# Altium integrated library SubjuGator8.IntLib: 247 symbols (part 1 of 2) (continued)
## Res
designator R?  value 10k  (hidden comment: *)
Supplier 1: Digi-Key; Supplier Part Number 1: RMCF0603JT10K0CT-ND
footprint RES0603 (Chip Resistor, 2-Leads, Body 1.60x0.80mm, IPC Medium Density)
footprint FMP300 (Power resistor)
footprint FMP200 (Power resistor Yageo 2W)
footprint RES0402 (Chip Resistor, 2-Leads, Body 1.00x0.50mm, changed from previous)
footprint RES2512 (Chip Resistor, 2-Leads, Body 6.35x3.20mm, IPC Medium Density)
footprint RES1206 (Chip Resistor, 2-Leads, Body 3.20x1.60mm, IPC Medium Density)
footprint RES0805 (Chip Resistor, 2-Leads, Body 2.01x1.25mm, IPC Medium Density)
footprint WSBM8518L5000JK
pins: 1 A, 2 B

## RLS-567
designator L?
Inductor; Manufacturer_Name: RECOM Power; Manufacturer_Part_Number: RLS-567; Datasheet Link: https://componentsearchengine.com/Datasheets/1/RLS-567.pdf; Height: 3.1mm; Mouser Part Number: 919-RLS-567; Mouser Price/Stock: https://www.mouser.com/Search/Refine.aspx?Keyword=919-RLS-567
footprint RLS567
pins: 1, 2

## SPDT Slide Switch
designator S?  (value not drawn)
Supplier 1: Digi-Key; Supplier Part Number 1: 563-1318-1-ND
footprint CL-SB-12B-01T (SWITCH SLIDE SPDT 200MA 12V)
pins: 1, 2, 3

## SPST Slide Switch
designator SW?, comment 360-2610-ND
SPST Slide Switch; Supplier 1: Digi-Key; Supplier Part Number 1: 360-2610-ND
footprint AS11CP (SPST Slide Switch)
pins: In, Out

## SRN6045-8R2Y
designator L?  Inductance: 8.2uH  (hidden comment: SRN6045-8R2Y)
FIXED IND 8.2UH 2.7A 55 MOHM SMD; Manufacturer 1: Bourns Inc; Supplier 1: Digi-Key; Supplier Part Number 1: SRN6045-8R2YCT-ND; Manufacturer Part Number 1: SRN6045-8R2Y
footprint SRN6045 Series Inductor (SRN 6045 Series Inductor Bourns Inc)
pins: 1 A, 2 B

## SRR1206-5R0ML
designator L?, comment 5uH
FIXED IND 5UH 4.7A 22 MOHM SMD; Supplier 1: Digi-Key; Supplier Part Number 1: SRR1206-5R0MLCT-ND
footprint IND_2 (Inductor)
pins: 1 A, 2 B

## SRR1208-120ML
designator L?  Inductance: 12uH  (hidden comment: SRR1208-120ML)
FIXED IND 12UH 4.8A 25 MOHM SMD; Manufacturer 1: Bourns Inc; Supplier 1: Digi-Key; Supplier Part Number 1: SRR1208-120MLCT-ND; Manufacturer Part Number 1: SRR1208-120ML
footprint SRR1208 Series (SSR1208 Series Inductor from Bourns Inc)
pins: 1 A, 2 B

## T520B227M006ATE045
designator *
CAP TANT POLY 220UF 6.3V 1411; Manufacturer 1: Kemet; Manufacturer Part Number 1: T520B227M006ATE045; Supplier 1: Digi-Key; Supplier Part Number 1: 399-5755-1-ND
footprint C1411-molded,polarized (Molded Capacitor, 2-Leads, Body 3.50x2.80mm, IPC Medium Density)
pins: 1 A, 2 B
text: +

## UUD1V330MCL1GS
designator C?
CAP ALUM 33UF 20% 35V SMD; Manufacturer 1: Nichicon; Supplier 1: Digi-Key; Manufacturer Part Number 1: UUD1V330MCL1GS; Supplier Part Number 1: 493-2286-1-ND
footprint UUD1V330MCL1GS (CAP ALUM 33UF 20% 35V SMD)
pins: 1 A, 2 B
text: +

## XAL7070-562MEB
designator L?  Inductance: 5.6uH  (hidden comment: XAL7070-562MEB)
FIXED IND 5.6UH 13A 13.67 MOHM SMD; Manufacturer 1: Coil Craft; Manufacturer Part Number 1: XAL7070-562MEB
footprint XAL7070-562MEB (5.6uH inductor)
pins: 1 A, 2 B


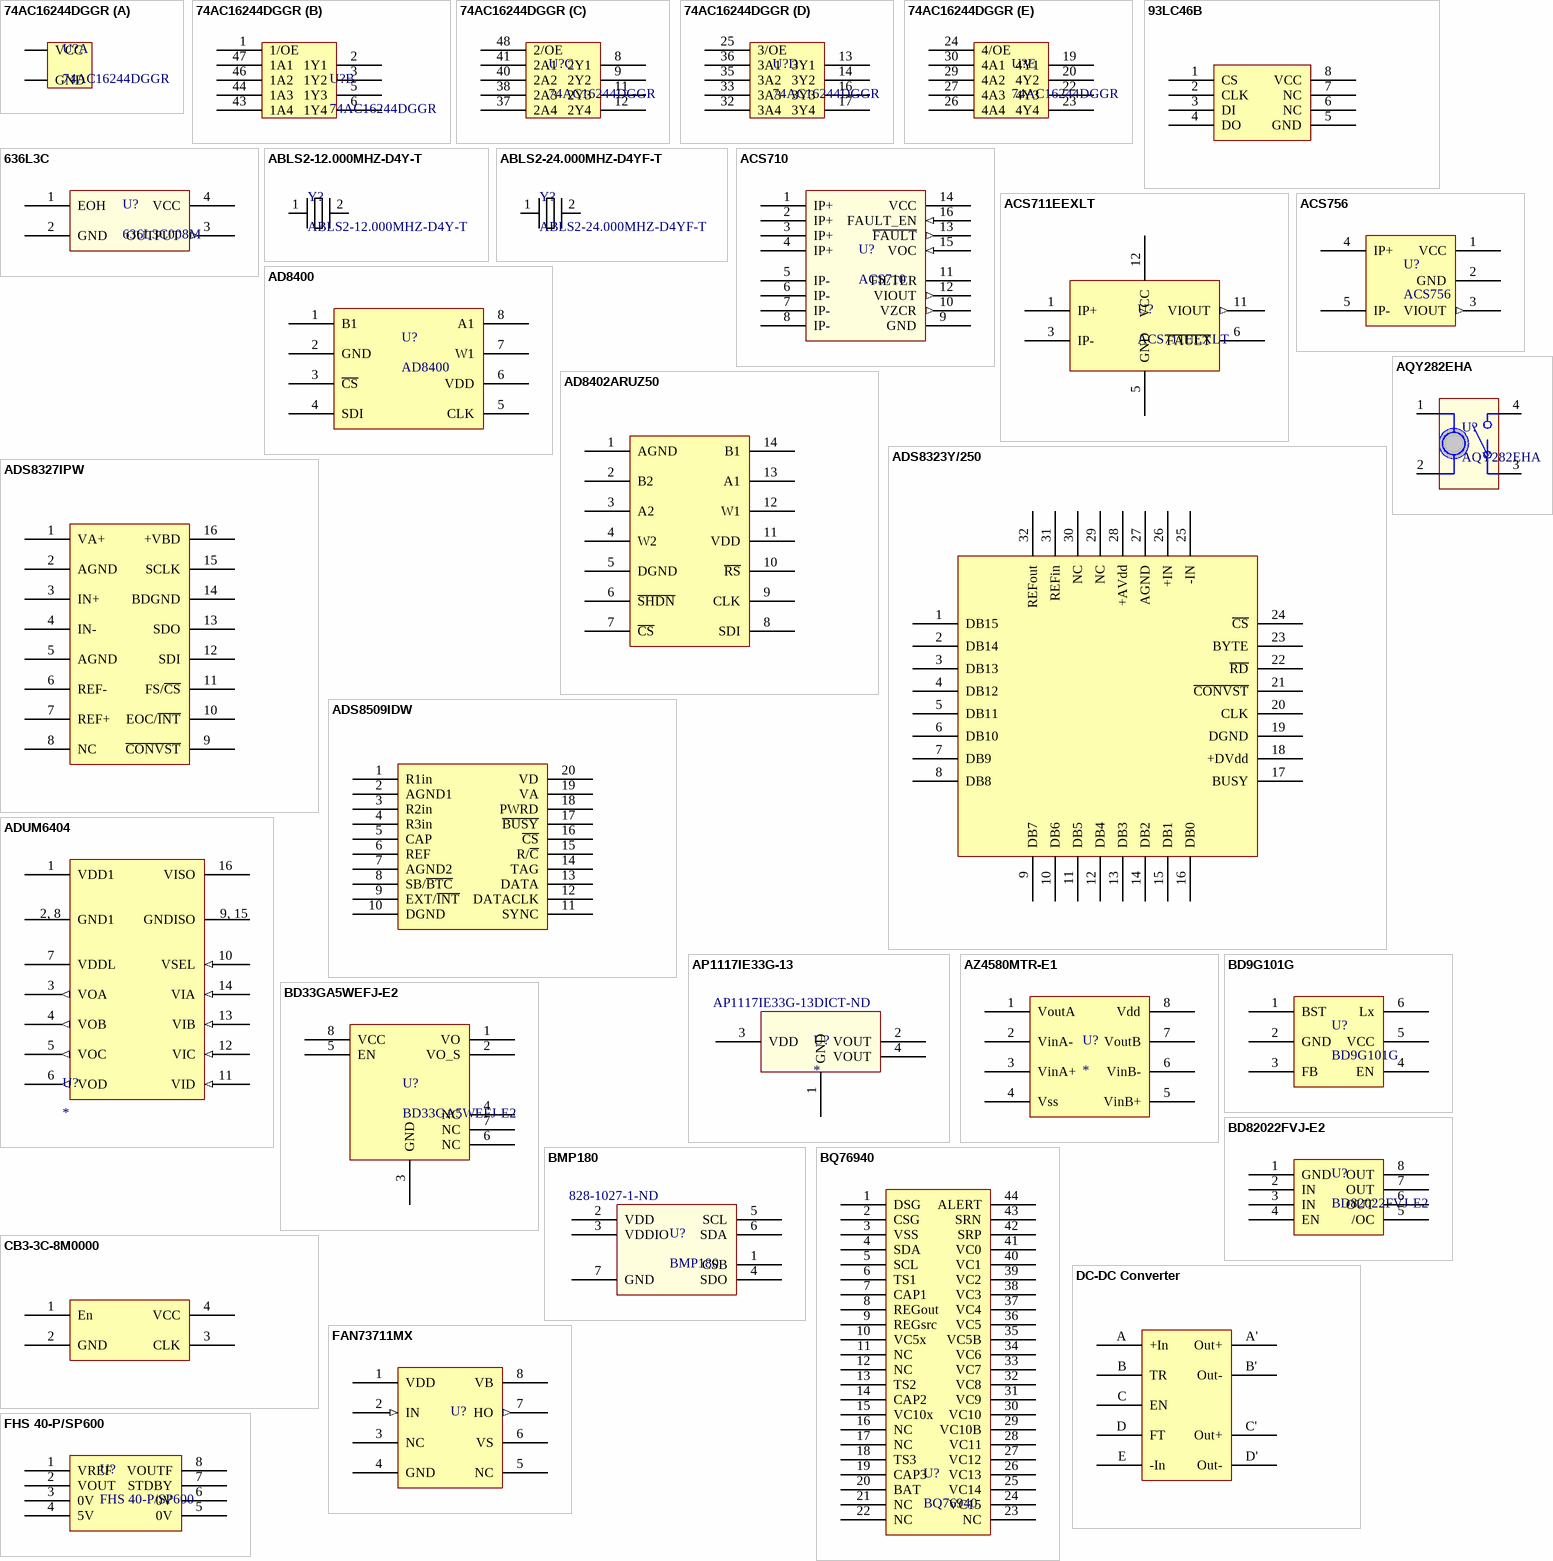
[diagram p4: symbols 74AC16244DGGR to FHS 40-P/SP600]

## 74AC16244DGGR
designator U?
IC BUFF/DVR TRI-ST 16BIT 48TSSOP; Supplier 1: Digi-Key; Supplier Part Number 1: 296-15845-1-ND
footprint 74AC16244DGGR (TSSOP, 48-Leads, Body 12.50x6.10mm, Pitch 0.50mm, IPC Medium Density)
part A pins: GND, VCC
part B pins: 1 1/OE, 2 1Y1, 3 1Y2, 5 1Y3, 6 1Y4, 43 1A4, 44 1A3, 46 1A2, 47 1A1
part C pins: 8 2Y1, 9 2Y2, 11 2Y3, 12 2Y4, 37 2A4, 38 2A3, 40 2A2, 41 2A1, 48 2/OE
part D pins: 13 3Y1, 14 3Y2, 16 3Y3, 17 3Y4, 25 3/OE, 32 3A4, 33 3A3, 35 3A2, 36 3A1
part E pins: 19 4Y1, 20 4Y2, 22 4Y3, 23 4Y4, 24 4/OE, 26 4A4, 27 4A3, 29 4A2, 30 4A1

## 93LC46B
designator U?
IC EEPROM 1KBIT 2MHZ 8SOIC; Supplier 1: Digi-Key; Supplier Part Number 1: 93LC46BT-I/SNCT-ND
footprint SOIC-8pin (For 296-1345-1-ND)
pins: 1 CS, 2 CLK, 3 DI, 4 DO, 5 GND, 6 NC, 7 NC, 8 VCC

## 636L3C
designator U?, comment 636L3C008M
HCMOS/TTL Clock Oscillator; Supplier 1: Digi-Key; Supplier Part Number 1: CTX1005CT-ND
footprint 636L3C
pins: 1 EOH, 2 GND (power), 3 OUTPUT (out), 4 VCC (power)

## ABLS2-12.000MHZ-D4Y-T
designator Y?
12MHz ±30ppm Crystal 18pF 50 Ohm -40°C ~ 85°C Surface Mount HC49/US; Supplier 1: Digi-Key; Supplier Part Number 1: 535-9869-1-ND
footprint HC49/US
pins: 1, 2

## ABLS2-24.000MHZ-D4YF-T
designator Y?
24MHz ±30ppm Crystal 18pF 40 Ohm -40°C ~ 85°C Surface Mount HC49/US; Supplier 1: Digi-Key; Supplier Part Number 1: 535-9881-1-ND
footprint HC49/US
pins: 1, 2

## ACS710
designator U?
Current Sensor with Integrated Overcurrent Detection; Supplier 1: Digi-Key; Supplier Part Number 1: 620-1334-1-ND
footprint ACS710 (SOIC, 16-Leads, Body 10.5x7.6mm (max), Pitch 1.27mm, IPC Medium Density)
footprint ACS710_NOPIN (Hacked footprint to make battery board look nice.)
pins: 1 IP+, 2 IP+, 3 IP+, 4 IP+, 5 IP-, 6 IP-, 7 IP-, 8 IP-, 9 GND (power), 10 VZCR (out), 11 FILTER, 12 VIOUT (out), 13 ~{FAULT} (out), 14 VCC (power), 15 VOC (in), 16 FAULT_EN (in)

## ACS711EEXLT
designator U?
Hall Effect Linear Current Sensor with Overcurrent  Fault Output for < 100 V Isolation Applications; Supplier 1: Digi-Key; Supplier Part Number 1: 620-1484-1-ND
footprint ACS711KEXLT
pins: 1 IP+, 3 IP-, 5 GND, 6 ~{FAULT} (oc), 11 VIOUT (out), 12 VCC (power)

## ACS756
designator U?
Hall Effect-Based Linear Current Sensor IC; Supplier 1: Digi-Key; Supplier Part Number 1: 620-1239-ND
footprint ACS756 (Hall Effect-Based Linear Current Sensor)
pins: 1 VCC (power), 2 GND (power), 3 VIOUT (out), 4 IP+, 5 IP-

## AD8400
designator U?
IC DGTL POT 8BIT 100K 1CH 8-SOIC; Supplier 1: Digi-Key; Supplier Part Number 1: AD8400ARZ100-ND
footprint SOIC-8PIN (For 296-1345-1-ND)
pins: 1 B1, 2 GND, 3 ~{CS}, 4 SDI, 5 CLK, 6 VDD, 7 W1, 8 A1

## AD8402ARUZ50
designator U?, comment 50k Pot
IC POT DIG DUAL 50K 8BIT 14TSSOP; Supplier 1: Digi-Key; Supplier Part Number 1: AD8402ARUZ50-ND
footprint TSSOP-14 (For AD8402ARUZ50-ND (Digital Pot))
pins: 1 AGND, 2 B2, 3 A2, 4 W2, 5 DGND, 6 ~{SHDN}, 7 ~{CS}, 8 SDI, 9 CLK, 10 ~{RS}, 11 VDD, 12 W1, 13 A1, 14 B1

## ADS8323Y/250
designator U?, comment ADC 16bit 500kHz
IC A/D CONV 16BIT BIPLR 32-TQFP; Supplier 1: Digi-Key; Supplier Part Number 1: ADS8323Y/250CT-ND
footprint 32-TQFP (Used for 16 bit external ADC)
pins: 1 DB15, 2 DB14, 3 DB13, 4 DB12, 5 DB11, 6 DB10, 7 DB9, 8 DB8, 9 DB7, 10 DB6, 11 DB5, 12 DB4, 13 DB3, 14 DB2, 15 DB1, 16 DB0, 17 BUSY, 18 +DVdd, 19 DGND, 20 CLK, 21 ~{CONVST}, 22 ~{RD}, 23 BYTE, 24 ~{CS}, 25 -IN, 26 +IN, 27 AGND, 28 +AVdd, 29 NC, 30 NC, 31 REFin, 32 REFout

## ADS8327IPW
designator U?
IC ADC 16BIT 500KSPS 16-TSSOP; Supplier 1: Digi-Key; Supplier Part Number 1: 296-19764-ND
footprint TSSOP-16pin (For 296-19764-ND)
pins: 1 VA+, 2 AGND, 3 IN+, 4 IN-, 5 AGND, 6 REF-, 7 REF+, 8 NC, 9 ~{CONVST}, 10 EOC/~{INT}, 11 FS/~{CS}, 12 SDI, 13 SDO, 14 BDGND, 15 SCLK, 16 +VBD

## ADS8509IDW
designator U?
IC ADC 16BIT 250KSPS SRL 20SOIC; Suppiler Part Number 1: 296-18087-5-ND; Supplier 1: Digi-Key
footprint SOIC-20pin (For 296-18087-5-ND)
pins: 1 R1in, 2 AGND1, 3 R2in, 4 R3in, 5 CAP, 6 REF, 7 AGND2, 8 SB/~{BTC}, 9 EXT/~{INT}, 10 DGND, 11 SYNC, 12 DATACLK, 13 DATA, 14 TAG, 15 R/~{C}, 16 ~{CS}, 17 ~{BUSY}, 18 PWRD, 19 VA, 20 VD

## ADUM6404
designator U?
Digital Isolator, 4 channel, with isolated power
footprint SOIC127P1030X265-16N (SOIC, 16-Leads, Body 10.30x7.50mm, Pitch 1.27mm, IPC Medium Density)
pins: 1 VDD1 (power), 2 GND1 (power), 3 VOA (out), 4 VOB (out), 5 VOC (out), 6 VOD (out), 7 VDDL (power), 8 GND1 (power), 9 GNDISO (power), 10 VSEL (in), 11 VID (in), 12 VIC (in), 13 VIB (in), 14 VIA (in), 15 GNDISO (power), 16 VISO
text: 2, 8; 9, 15

## AP1117IE33G-13
designator U?  Supplier Part Number 1: AP1117IE33G-13DICT-ND
3.3V 1A DROPOUT POSITIVE ADJUSTABLE OR FIXED-MODE REGULATOR; Supplier 1: Digi-Key
footprint AP1117IE33G-13 (SOT223, 4-Leads, Body 6.6x7.1mm (max), Pitch 2.30mm, IPC Medium Density)
pins: 1 GND (power), 2 VOUT (power), 3 VDD (power), 4 VOUT (power)

## AQY282EHA
designator U?
PhotoMOS Solid State Relay; Supplier 1: Digi-Key; Supplier Part Number 1: AQY282EHA-ND
footprint AQY282EHA (SOP, 4-Leads, Body 4.3x4.6mm (max), Pitch 2.54mm, IPC Medium Density)
pins: 1 A, 2 C, 3 S2, 4 S1

## AZ4580MTR-E1
designator U?
IC OPAMP GEN PURP SO-8; Supplier 1: Digi-Key; Supplier Part Number 1: AZ4580MTR-E1DICT-ND
footprint 8-SOIC (Used for LMH6612)
pins: 1 VoutA, 2 VinA-, 3 VinA+, 4 Vss, 5 VinB+, 6 VinB-, 7 VoutB, 8 Vdd

## BD9G101G
designator U?
Simple Step-down Switching Regulators with Built-in Power MOSFET; Supplier 1: Digi-Key; Supplier Part Number 1: BD9G101G-CT-ND
footprint BD9G101G (Simple Step-down Switching Regulators with Built-in Power MOSFET)
pins: 1 BST, 2 GND, 3 FB, 4 EN, 5 VCC, 6 Lx

## BD33GA5WEFJ-E2
designator U?
IC REG LDO 3.3V 0.5A 8HTSOP-J; Supplier 1: Digi-Key; Supplier Part Number 1: BD33GA5WEFJ-E2CT-ND
footprint BD33GA5WEFJ-E2 (IC REG LDO 3.3V 0.5A 8HTSOP-J)
pins: 1 VO, 2 VO_S, 3 GND, 4 NC, 5 EN, 6 NC, 7 NC, 8 VCC

## BD82022FVJ-E2
designator U?
IC USB PWR SW HI SIDE 1CH 8TSSOP; Manufacturer 1: Rohm Semiconductor; Manufacturer Part Number 1: BD82022FVJ-E2; Supplier Part Number 1: BD82022FVJ-E2CT-ND; Supplier 1: Digi-Key
footprint TSSOP-8 (TSOP, 8-Leads, Body 3.00x3.00mm, Pitch 0.65mm, IPC Medium Density)
pins: 1 GND, 2 IN, 3 IN, 4 EN, 5 /OC, 6 OUT, 7 OUT, 8 OUT

## BMP180
designator U?  Supplier Part Number 1: 828-1027-1-ND
Digital Pressure Sensor; Supplier 1: Digi-Key
footprint BMP180
pins: 1 CSB, 2 VDD (power), 3 VDDIO (power), 4 SDO, 5 SCL, 6 SDA, 7 GND (power)

## BQ76940
designator U?
IC BATT MFMT LI-ION AFE 44TSOP; Supplier 1: Digi-Key; Supplier Part Number 1: 296-37789-5-ND
footprint BQ7694003DBT (TSSOP, 44-Leads, Body 11.15x4.40mm, Pitch 0.50mm, IPC Medium Density)
pins: 1 DSG, 2 CSG, 3 VSS, 4 SDA, 5 SCL, 6 TS1, 7 CAP1, 8 REGout, 9 REGsrc, 10 VC5x, 11 NC, 12 NC, 13 TS2, 14 CAP2, 15 VC10x, 16 NC, 17 NC, 18 TS3, 19 CAP3, 20 BAT, 21 NC, 22 NC, 23 NC, 24 VC15, 25 VC14, 26 VC13, 27 VC12, 28 VC11, 29 VC10B, 30 VC10, 31 VC9, 32 VC8, 33 VC7, 34 VC6, 35 VC5B, 36 VC5, 37 VC4, 38 VC3, 39 VC2, 40 VC1, 41 VC0, 42 SRP, 43 SRN, 44 ALERT

## CB3-3C-8M0000
designator U?, comment 8MHz Oscillator
OSC XO 8.000MHZ HCMOS TTL SMD; Supplier 1: Digi-Key; Supplier Part Number 1: CTX264CT-ND
footprint 4-SMD (For 8MHz Oscillator)
pins: 1 En, 2 GND, 3 CLK, 4 VCC

## DC-DC Converter
designator U?
28V Switching Regulator; Manufacturer 1: Vicorpower; Manufacturer Part Number 1: DCM48AP280T320A50
footprint DCM Footprint (For DC-DC Converter Module)
pins: A +In, A' Out+, B TR, B' Out-, C EN, C' Out+, D FT, D' Out-, E -In

## FAN73711MX
designator U?  (value not drawn)
High current, High-side gate drive IC; Supplier 1: Digi-Key; Supplier Part Number 1: FAN73711MXDKR-ND
footprint FAN73711MXCT (High side FET driver)
pins: 1 VDD, 2 IN (in), 3 NC, 4 GND, 5 NC, 6 VS, 7 HO (out), 8 VB

## FHS 40-P/SP600
designator U?
Supplier 1: Digi-Key; Supplier Part Number 1: 398-1057-1-ND
footprint FHS 40-P/SP600 (SENSOR CURRENT 100A 5V BI 8SOIC)
pins: 1 VREF, 2 VOUT, 3 0V, 4 5V, 5 0V, 6 0V, 7 STDBY, 8 VOUTF

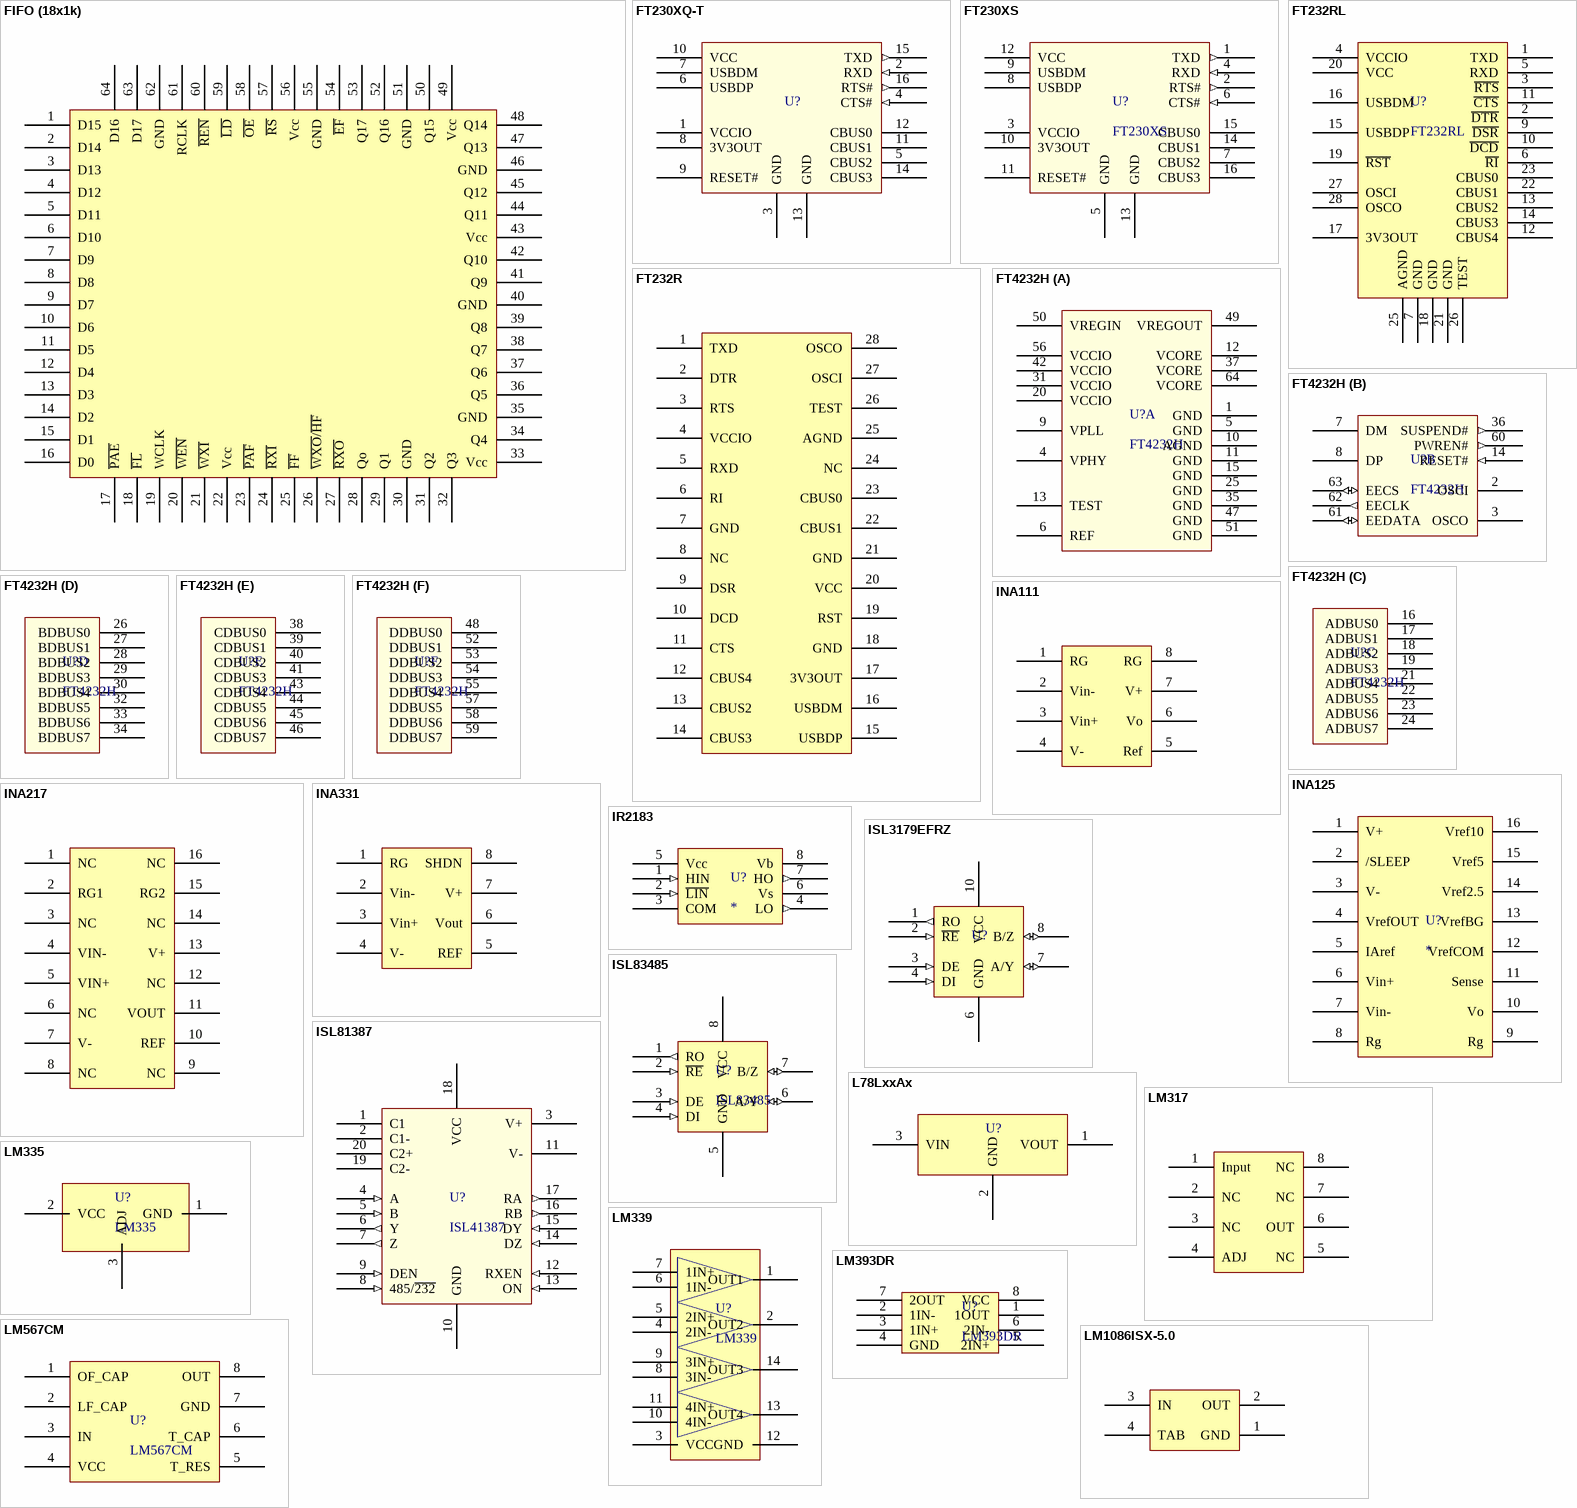
[diagram p5: symbols FIFO (18x1k) to LM1086ISX-5.0]

## FIFO (18x1k)
designator U?
IC SYNC FIFO MEM 1KX18 64LQFP; Supplier 1: Digi-Key; Supplier Part Number 1: CY7C4225-10AXI-ND
footprint 64-LQFP (For IDT 64 pin FIFO)
pins: 1 D15, 2 D14, 3 D13, 4 D12, 5 D11, 6 D10, 7 D9, 8 D8, 9 D7, 10 D6, 11 D5, 12 D4, 13 D3, 14 D2, 15 D1, 16 D0, 17 ~{PAE}, 18 ~{FL}, 19 WCLK, 20 ~{WEN}, 21 ~{WXI}, 22 Vcc, 23 ~{PAF}, 24 ~{RXI}, 25 ~{FF}, 26 ~{WXO}/~{HF}, 27 ~{RXO}, 28 Qo, 29 Q1, 30 GND, 31 Q2, 32 Q3, 33 Vcc, 34 Q4, 35 GND, 36 Q5, 37 Q6, 38 Q7, 39 Q8, 40 GND, 41 Q9, 42 Q10, 43 Vcc, 44 Q11, 45 Q12, 46 GND, 47 Q13, 48 Q14, 49 Vcc, 50 Q15, 51 GND, 52 Q16, 53 Q17, 54 ~{EF}, 55 GND, 56 Vcc, 57 ~{RS}, 58 ~{OE}, 59 ~{LD}, 60 ~{REN}, 61 RCLK, 62 GND, 63 D17, 64 D16

## FT230XQ-T
designator U?  (value not drawn)
IC USB SERIAL BASIC UART 16QFN; Supplier 1: Digi-Key; Supplier Part Number 1: 768-1153-ND
footprint FT230XQ-T (IC USB SERIAL BASIC UART 16QFN)
pins: 1 VCCIO (power), 2 RXD (in), 3 GND (power), 4 CTS# (in), 5 CBUS2, 6 USBDP, 7 USBDM, 8 3V3OUT, 9 RESET#, 10 VCC (power), 11 CBUS1, 12 CBUS0, 13 GND (power), 14 CBUS3, 15 TXD (out), 16 RTS# (out)

## FT230XS
designator U?
USB To Basic UART IC; Supplier 1: Digi-Key; Supplier Part Number 1: 768-1154-5-ND
footprint FT230XS (SOP, 16-Leads, Body 4.90x3.90mm, Pitch 0.64mm, IPC Medium Density)
pins: 1 TXD (out), 2 RTS# (out), 3 VCCIO (power), 4 RXD (in), 5 GND (power), 6 CTS# (in), 7 CBUS2, 8 USBDP, 9 USBDM, 10 3V3OUT, 11 RESET#, 12 VCC (power), 13 GND (power), 14 CBUS1, 15 CBUS0, 16 CBUS3

## FT232R
designator U?
IC USB FS SERIAL UART 28-SSOP; Supplier 1: Digi-Key; Supplier Part Number 1: 768-1007-1-ND
footprint SSOP-28 (FTDI FT232R)
pins: 1 TXD, 2 DTR, 3 RTS, 4 VCCIO, 5 RXD, 6 RI, 7 GND, 8 NC, 9 DSR, 10 DCD, 11 CTS, 12 CBUS4, 13 CBUS2, 14 CBUS3, 15 USBDP, 16 USBDM, 17 3V3OUT, 18 GND, 19 RST, 20 VCC, 21 GND, 22 CBUS1, 23 CBUS0, 24 NC, 25 AGND, 26 TEST, 27 OSCI, 28 OSCO

## FT232RL
designator U?
IC USB FS SERIAL UART 28-SSOP; Supplier Part Number 1: 768-1007-1-ND; Supplier 1: Digi-Key
footprint SSOP_28_N (For FT232RL-Tube)
pins: 1 TXD, 2 ~{DTR}, 3 ~{RTS}, 4 VCCIO, 5 RXD, 6 ~{RI}, 7 GND, 9 ~{DSR}, 10 ~{DCD}, 11 ~{CTS}, 12 CBUS4, 13 CBUS2, 14 CBUS3, 15 USBDP, 16 USBDM, 17 3V3OUT, 18 GND, 19 ~{RST}, 20 VCC, 21 GND, 22 CBUS1, 23 CBUS0, 25 AGND, 26 TEST, 27 OSCI, 28 OSCO

## FT4232H
designator U?
Quad High Speed USB to Multipurpose UART/MPSSE; Supplier 1: Digi-Key; Supplier Part Number 1: 768-1026-1-ND
footprint FT4232HL (TSQFP, 64-Leads, Body 10.00x10.00mm, Pitch 0.50mm, IPC Medium Density)
part A pins: 1 GND (power), 4 VPHY (power), 5 GND (power), 6 REF, 9 VPLL (power), 10 AGND (power), 11 GND (power), 12 VCORE (power), 13 TEST, 15 GND (power), 20 VCCIO (power), 25 GND (power), 31 VCCIO (power), 35 GND (power), 37 VCORE (power), 42 VCCIO (power), 47 GND (power), 49 VREGOUT (power), 50 VREGIN (power), 51 GND (power), 56 VCCIO (power), 64 VCORE (power)
part B pins: 2 OSCI, 3 OSCO, 7 DM, 8 DP, 14 RESET# (in), 36 SUSPEND# (out), 60 PWREN# (out), 61 EEDATA (io), 62 EECLK (out), 63 EECS (io)
part C pins: 16 ADBUS0, 17 ADBUS1, 18 ADBUS2, 19 ADBUS3, 21 ADBUS4, 22 ADBUS5, 23 ADBUS6, 24 ADBUS7
part D pins: 26 BDBUS0, 27 BDBUS1, 28 BDBUS2, 29 BDBUS3, 30 BDBUS4, 32 BDBUS5, 33 BDBUS6, 34 BDBUS7
part E pins: 38 CDBUS0, 39 CDBUS1, 40 CDBUS2, 41 CDBUS3, 43 CDBUS4, 44 CDBUS5, 45 CDBUS6, 46 CDBUS7
part F pins: 48 DDBUS0, 52 DDBUS1, 53 DDBUS2, 54 DDBUS3, 55 DDBUS4, 57 DDBUS5, 58 DDBUS6, 59 DDBUS7

## INA111
designator U?, comment Instr. Amp
IC OPAMP INSTR 2MHZ 8DIP; Supplier 1: Digi-Key; Supplier Part Number 1: INA111AP-ND
footprint DIP8
pins: 1 RG, 2 Vin-, 3 Vin+, 4 V-, 5 Ref, 6 Vo, 7 V+, 8 RG

## INA125
designator U?
Instrumentation Amplifier; Supplier 1: Digi-Key; Supplier Part Number 1: INA125UA-ND
footprint SOIC127P600X175-16N (SOIC, 16-Leads, Body 9.90x3.90mm, Pitch 1.27mm, IPC Medium Density)
pins: 1 V+, 2 /SLEEP, 3 V-, 4 VrefOUT, 5 IAref, 6 Vin+, 7 Vin-, 8 Rg, 9 Rg, 10 Vo, 11 Sense, 12 VrefCOM, 13 VrefBG, 14 Vref2.5, 15 Vref5, 16 Vref10

## INA217
designator U?
IC OPAMP INSTR 3.4MHZ 16SOIC; Supplier 1: Digi-Key; Supplier Part Number 1: 296-13645-1-ND
footprint SOIC-16
pins: 1 NC, 2 RG1, 3 NC, 4 VIN-, 5 VIN+, 6 NC, 7 V-, 8 NC, 9 NC, 10 REF, 11 VOUT, 12 NC, 13 V+, 14 NC, 15 RG2, 16 NC

## INA331
designator U?, comment Inst. Amp
IC OPAMP INSTR 2MHZ RRO 8VSSOP; Suplier Part Number 1: 296-12202-1-ND; Supplier 1: Digi-Key
footprint TSSOP-8n
pins: 1 RG, 2 Vin-, 3 Vin+, 4 V-, 5 REF, 6 Vout, 7 V+, 8 SHDN

## IR2183
designator U?
Half-Bridge Driver; Supplier 1: Digi-Key; Supplier Part Number 1: IR2183SPBF-ND
footprint IR2183S
pins: 1 HIN (in), 2 ~{LIN} (in), 3 COM (power), 4 LO (out), 5 Vcc (power), 6 Vs (power), 7 HO (out), 8 Vb

## ISL3179EFRZ
designator U?  (value not drawn)
TXRX ESD 3.3V RS-485/422 10-DFN; Supplier 1: Digi-Key; Supplier Part Number 1: ISL3179EFRZ-ND
footprint ISL3179EFRZ (TXRX ESD 3.3V RS-485/422 10-DFN)
footprint ISL3179EFRZ_NO_VIAS (TXRX ESD 3.3V RS-485/422 10-DFN)
pins: 1 RO (out), 2 ~{RE} (in), 3 DE (in), 4 DI (in), 6 GND (power), 7 A/Y (io), 8 B/Z (io), 10 VCC (power)

## ISL81387
designator U?, comment ISL41387
5V RS-232/RS-485 Transceiver
footprint ISL81387IAZ (SOP, 20-Leads, Body 7.3x5.4mm (max), Pitch 0.65mm, IPC Medium Density)
pins: 1 C1, 2 C1-, 3 V+, 4 A (in), 5 B (in), 6 Y (out), 7 Z (out), 8 485/~{232} (in), 9 DEN (in), 10 GND (power), 11 V-, 12 RXEN (in), 13 ON (in), 14 DZ (in), 15 DY (in), 16 RB (out), 17 RA (out), 18 VCC (power), 19 C2-, 20 C2+

## ISL83485
designator U?
3.3V RS485 Transceiver; Supplier 1: Digi-Key; Supplier Part Number 1: ISL83485IBZ-ND
footprint ISL8348xIBZ (SOIC, 8-Leads, Body 4.90x3.90mm, Pitch 1.27mm, IPC Medium Density)
pins: 1 RO (out), 2 ~{RE} (in), 3 DE (in), 4 DI (in), 5 GND (power), 6 A/Y (io), 7 B/Z (io), 8 VCC (power)

## L78LxxAx
designator U?, comment L78L15AC  (value not drawn)
Positive Voltage Regulator; Supplier 1: Digi-Key; Supplier Part Number 1: 497-13129-ND
footprint L78LxxAxZ (Positive voltage regulator TO-92)
footprint L78LxxAxUTR (SOT89, 3-Leads, Body 4.50x2.45mm, Pitch 1.50mm, Lead Span 4.1mm, IPC Medium Density)
pins: 1 VOUT, 2 GND (power), 3 VIN

## LM317
designator U?
IC REG LDO ADJ 0.1A 8SOIC; Supplier 1: Digi-Key; Supplier Part Number 1: 296-26092-5-ND
footprint SOIC-8N (LM317 Footprint)
pins: 1 Input, 2 NC, 3 NC, 4 ADJ, 5 NC, 6 OUT, 7 NC, 8 NC

## LM335
designator U?
IC SENSOR PRECISION TEMP TO92-3; Supplier: Digikey; Supplier Part Number: LM335ZNS/NOPB-ND
footprint LM335 (IC SENSOR PRECISION TEMP TO92-3)
pins: 1 GND, 2 VCC, 3 ADJ

## LM339
designator U?
IC QUAD DIFF COMPARATOR 14-TSSOP; Supplier 1: Digi-Key; Supplier Part Number 1: 296-18454-1-ND
footprint LM339 (TSOP, 14-Leads, Body 5.00x4.40mm, Pitch 0.65mm, IPC Medium Density)
pins: 1 OUT1, 2 OUT2, 3 VCC, 4 2IN-, 5 2IN+, 6 1IN-, 7 1IN+, 8 3IN-, 9 3IN+, 10 4IN-, 11 4IN+, 12 GND, 13 OUT4, 14 OUT3

## LM393DR
designator U?
LM393DR Comparator; Supplier 1: Digi-key; Supplier Part Number 1: 296-1015-1-ND
footprint LM393DR
pins: 1 1OUT, 2 1IN-, 3 1IN+, 4 GND, 5 2IN+, 6 2IN-, 7 2OUT, 8 VCC

## LM567CM
designator U?
IC TONE DECODR PHAS LOC LP 8SOIC; Supplier Part Number 1: LM567CM/NOPB-ND; Supplier 1: Digi-Key
footprint SOIC-8PIN (For 296-1345-1-ND)
pins: 1 OF_CAP, 2 LF_CAP, 3 IN, 4 VCC, 5 T_RES, 6 T_CAP, 7 GND, 8 OUT

## LM1086ISX-5.0
designator U?, comment 5V LDO Regulator
IC REG LDO 5V 1.5A DDPAK; Supplier Part Number 1: LM1086ISX-5.0/NOPBCT-ND; Supplier 1: Digi-Key
footprint DPAK254P1435X464-4N (D2-PAK, 4-Pads, Body 7.55x8.56mm (max), IPC Medium Density)
pins: 1 GND, 2 OUT, 3 IN, 4 TAB

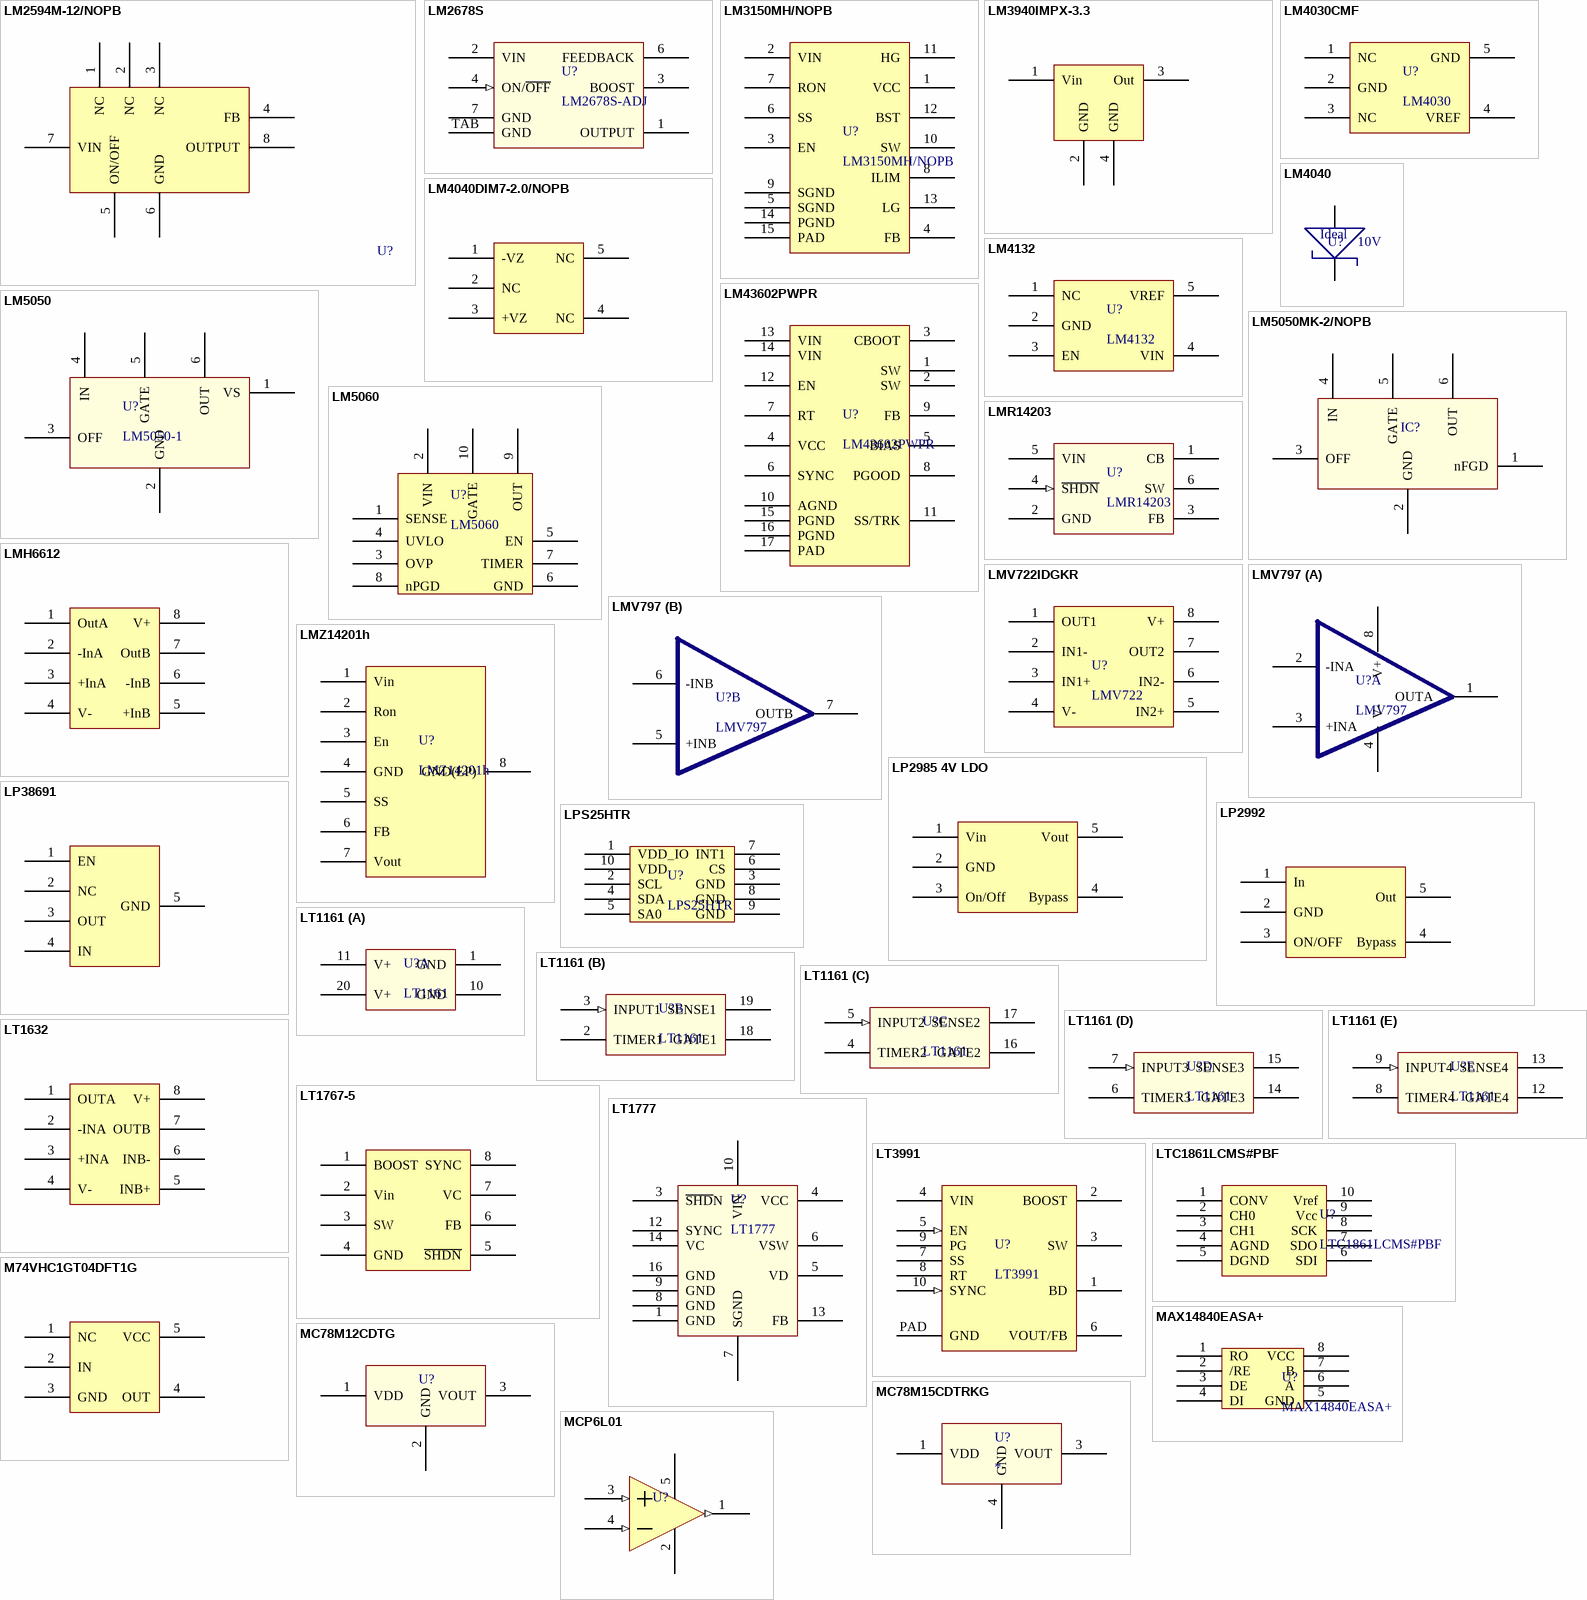
[diagram p6: symbols LM2594M-12/NOPB to MCP6L01]

## LM2594M-12/NOPB
designator U?  (value not drawn)
IC REG BUCK 12V 0.5A 8-SOIC; Supplier 1: Digi-Key; Supplier Part Number 1: LM2594M-12/NOPB-ND
footprint LM2594M-12/NOPB (IC REG BUCK 12V 0.5A 8-SOIC)
pins: 1 NC, 2 NC, 3 NC, 4 FB, 5 ON/OFF, 6 GND, 7 VIN, 8 OUTPUT

## LM2678S
designator U?, comment LM2678S-ADJ
Simple Switcher High Efficiency 5A Step-Down Voltage Regulator; Supplier 1: Digi-Key; Supplier Part Number 1: LM2678SX-ADJ/NOPBCT-ND
footprint LM2678S
pins: 1 OUTPUT, 2 VIN (power), 3 BOOST, 4 ON/~{OFF} (in), 6 FEEDBACK (power), 7 GND (power), TAB GND (power)

## LM3150MH/NOPB
designator U?
IC REG CTRLR BUCK 14TSSOP; Manufacturer 1: Texas Instruments; Manufacturer Part Number 1: LM3150MH/NOPB; Supplier Part Number 1: LM3150MH/NOPB-ND; Supplier 1: Digi-Key
footprint TSSOP-14 EP (TSOP, 14-Leads, Body 5.00x4.40mm, Pitch 0.65mm, Thermal Pad 3.10x3.00mm, IPC Medium Density)
pins: 1 VCC, 2 VIN, 3 EN, 4 FB, 5 SGND, 6 SS, 7 RON, 8 ILIM, 9 SGND, 10 SW, 11 HG, 12 BST, 13 LG, 14 PGND, 15 PAD

## LM3940IMPX-3.3
designator U?, comment 3.3V LDO Reg
IC REG LDO 3.3V 1A SOT223; Supplier 1: Digi-Key; Supplier Part Number 1: LM3940IMPX-3.3/NOPBCT-ND
footprint SOT23-4n (SOT223, 4-Leads, Body 6.50x7.00mm (avg), Pitch 2.30mm, IPC Medium Density)
pins: 1 Vin, 2 GND, 3 Out, 4 GND

## LM4030CMF
designator U?, comment LM4030
LM4030CMF-2.5/NOPB; Supplier 1: Digi-Key; Supplier Part Number 1: LM4030CMF-2.5/NOPBCT-ND
footprint SOT23-5 (Used for LP2992)
pins: 1 NC, 2 GND, 3 NC, 4 VREF, 5 GND

## LM4040
designator U?  Reverse Breakdown Voltage: 10V  (hidden comment: LM4040)
LM4040AIM3-10.0/NOPBCT; Supplier 1: Digi-Key; Supplier Part Number 1: LM4040AIM3-10.0/NOPBCT-ND
footprint LM4040 (SOT23, 3-Leads, Body 2.92x2.37mm, Pitch 0.95mm, IPC Medium Density)
pins: 1 Anode, 2 Cathode
text: Ideal

## LM4040DIM7-2.0/NOPB
designator U?, comment VRef 2.048V
IC VREF SHUNT 2.048V SC70; Supplier 1: Digi-Key; Supplier Part Number 1: 296-38736-1-ND
footprint SOT35-5pin (For 296-38736-1-ND)
pins: 1 -VZ, 2 NC, 3 +VZ, 4 NC, 5 NC

## LM4132
designator U?
IC VREF SERIES 2.5V SOT23-5; Supplier 1: Digi-Key; Supplier Part Number 1: LM4132AMF-2.5/NOPBCT-ND
footprint SOT23-5 (Used for LP2992)
pins: 1 NC, 2 GND, 3 EN, 4 VIN, 5 VREF

## LM5050
designator U?, comment LM5050-1
High-Side OR-ing FET Controller; Supplier 1: Digi-Key; Supplier Part Number 1: LM5050MK-1/NOPBCT-ND
footprint LM5050 (SOT23, 6-Leads, Body 2.90x2.80mm, Pitch 0.95mm, IPC Medium Density)
pins: 1 VS, 2 GND, 3 OFF, 4 IN, 5 GATE, 6 OUT

## LM5050MK-2/NOPB
designator IC?  (value not drawn)
IC OR CTRLR N+1 6SOT; Supplier 1: Digi-Key; Supplier Part Number 1: LM5050MK-2/NOPBDKR-ND
footprint LM5050MK-2/NOPB (IC OR CTRLR N+1 6SOT)
pins: 1 nFGD, 2 GND, 3 OFF, 4 IN, 5 GATE, 6 OUT

## LM5060
designator U?
Hotswap Controller; Supplier 1: Digi-Key; Supplier Part Number 1: LM5060Q1MM/NOPBCT-ND
footprint LM5060 (10-VSSOP)
pins: 1 SENSE, 2 VIN, 3 OVP, 4 UVLO, 5 EN, 6 GND, 7 TIMER, 8 nPGD, 9 OUT, 10 GATE

## LM43602PWPR
designator U?
IC REG BUCK ADJ 2A SYNC 16HTSSOP; Manufacturer 1: Texas Instruments; Manufacturer Part Number 1: LM43602PWPR; Supplier Part Number 1: 296-37754-1-ND; Supplier 1: Digi-Key
footprint TSSOP-16 EP (TSOP, 16-Leads, Body 5.00x4.40mm, Pitch 0.65mm, Thermal Pad 3.29x2.41mm, IPC Medium Density)
pins: 1 SW, 2 SW, 3 CBOOT, 4 VCC, 5 BIAS, 6 SYNC, 7 RT, 8 PGOOD, 9 FB, 10 AGND, 11 SS/TRK, 12 EN, 13 VIN, 14 VIN, 15 PGND, 16 PGND, 17 PAD

## LMH6612
designator U?
IC OPAMP GP 130MHZ RRO 8SOIC; Supplier Part Number 1: LMH6612MA/NOPB-ND; Supplier 1: Digi-Key
footprint 8-SOIC (Used for LMH6612)
pins: 1 OutA, 2 -InA, 3 +InA, 4 V-, 5 +InB, 6 -InB, 7 OutB, 8 V+

## LMR14203
designator U?
Simple Switcher 42Vin 0.3A Step-Down Voltage Regulator; Supplier 1: Digi-Key; Supplier Part Number 1: LMR14203XMKE/NOPBCT-ND
footprint SOT95P280X110-6N (SOT23, 6-Leads, Body 2.90x2.80mm, Pitch 0.95mm, IPC Medium Density)
pins: 1 CB, 2 GND (power), 3 FB, 4 ~{SHDN} (in), 5 VIN, 6 SW

## LMV722IDGKR
designator U?, comment LMV722
IC OPAMP GP 10MHZ RRO 8VSSOP; Supplier 1: Digi-Key; Supplier Part Number 1: 296-27988-1-ND
footprint TSSOP-8N(2) (For LMV722)
pins: 1 OUT1, 2 IN1-, 3 IN1+, 4 V-, 5 IN2+, 6 IN2-, 7 OUT2, 8 V+

## LMV797
designator U?
IC OPAMP GP 17MHZ RRO 8VSSOP; Supplier 1: Digi-Key; Supplier Part Number 1: LMV797MM/NOPBCT-ND
footprint TSSOP-8N
part A pins: 1 OUTA   , 2 -INA, 3 +INA, 4 V-, 8 V+
part B pins: 5 +INB, 6 -INB, 7 OUTB   

## LMZ14201h
designator U?
IC BUCK SYNC ADJ 1A TO-PMOD-7; Supplier 1: Digi-Key; Supplier Part Number 1: LMZ14201HTZX/NOPBCT-ND
footprint TO-PMOD-7 (For LMZ14201h)
pins: 1 Vin, 2 Ron, 3 En, 4 GND, 5 SS, 6 FB, 7 Vout, 8 GND(EP)

## LP2985 4V LDO
designator U?, comment 4V LDO
IC REG LDO 4V 0.15A SOT23-5; Supplier 1: Digi-Key; Supplier Part Number 1: LP2985IM5-4.0/NOPBCT-ND
footprint SOT23-5pin (For LP2985IM5-4.0/NOPBCT-ND)
pins: 1 Vin, 2 GND, 3 On/Off, 4 Bypass, 5 Vout

## LP2992
designator U?
IC REG LDO 5V 0.25A SOT23-5; Supplier 1: Digi-Key; Supplier Part Number 1: LP2992IM5-5.0/NOPBCT-ND
footprint SOT23-5 (Used for LP2992)
pins: 1 In, 2 GND, 3 ON/OFF, 4 Bypass, 5 Out

## LP38691
designator U?, comment 3.3V LDO REG
IC REG LDO 3.3V 0.5A SOT223-5; Supplier 1: Digi-Key; Supplier Part Number 1: LP38693MP-3.3/NOPBCT-ND
footprint SOT223-8N (3.3V LDO)
pins: 1 EN, 2 NC, 3 OUT, 4 IN, 5 GND

## LPS25HTR
designator U?
IC MEMS PRESSURE SENSOR 10HCLGA; Supplier: Digikey; Supplier Part Number: 497-14380-1-ND
footprint LPS25HTR (IC MEMS PRESSURE SENSOR 10HCLGA)
pins: 1 VDD_IO, 2 SCL, 3 GND, 4 SDA, 5 SA0, 6 CS, 7 INT1, 8 GND, 9 GND, 10 VDD

## LT1161
designator U?
Quad Protected High-Side MOSFET Driver; Supplier 1: Digi-Key; Supplier Part Number 1: LT1161CSW#PBF-ND
part A pins: 1 GND (power), 10 GND (power), 11 V+ (power), 20 V+
part B pins: 2 TIMER1, 3 INPUT1 (in), 18 GATE1, 19 SENSE1
part C pins: 4 TIMER2, 5 INPUT2 (in), 16 GATE2, 17 SENSE2
part D pins: 6 TIMER3, 7 INPUT3 (in), 14 GATE3, 15 SENSE3
part E pins: 8 TIMER4, 9 INPUT4 (in), 12 GATE4, 13 SENSE4

## LT1632
designator U?
IC OPAMP GP 45MHZ RRO 8SO; Supplier 1: Digi-Key; Supplier Part Number 1: LT1632CS8#PBF-ND
footprint SOIC127P600-8N (For LT1632)
pins: 1 OUTA, 2 -INA, 3 +INA, 4 V-, 5 INB+, 6 INB-, 7 OUTB, 8 V+

## LT1767-5
designator U?
IC REG BUCK 5V 1.5A 8MSOP; Supplier 1: Digi-Key; Supplier Part Number 1: LT1767EMS8-5#PBF-ND
footprint MSOP-8n (LT1767)
pins: 1 BOOST, 2 Vin, 3 SW, 4 GND, 5 ~{SHDN}, 6 FB, 7 VC, 8 SYNC

## LT1777
designator U?
Low Noise Step-Down Switching Regulator; Supplier 1: Digi-Key; Supplier Part Number 1: LT1777CS#PBF-ND
pins: 1 GND (power), 3 ~{SHD}N, 4 VCC (power), 5 VD, 6 VSW, 7 SGND (power), 8 GND (power), 9 GND (power), 10 VIN (power), 12 SYNC, 13 FB, 14 VC, 16 GND (power)

## LT3991
designator U?
55V, 1.2A Step-Down Regulator with 2.8uA Quiescent Current; Supplier 1: Digi-Key; Supplier Part Number 1: LT3991EMSE#PBF-ND
footprint LTS3991MSE (TSSOP, 10-Leads, Body 3.1x3.1mm (max), Pitch 0.50mm, IPC Medium Density)
footprint LT3991DD (QFN, 10-Leads, Body 3.00x3.00mm, Pitch 0.50mm, Thermal Pad 2.38x1.65mm, IPC Medium Density)
pins: 1 BD, 2 BOOST, 3 SW, 4 VIN (power), 5 EN (in), 6 VOUT/FB, 7 SS, 8 RT, 9 PG (oc), 10 SYNC (in), PAD GND

## LTC1861LCMS#PBF
designator U?
IC ADC 2CH 12B 3V 150KSPS 10MSOP; Supplier 1: Digi-Key; Supplier Part Number 1: LTC1861LCMS#PBF-ND
footprint LTC1861LCMS#PBF (TSSOP, 10-Leads, Body 3.00x3.00mm, Pitch 0.50mm, IPC Medium Density)
pins: 1 CONV, 2 CH0, 3 CH1, 4 AGND, 5 DGND, 6 SDI, 7 SDO, 8 SCK, 9 Vcc, 10 Vref

## M74VHC1GT04DFT1G
designator U?, comment Level Shifter
IC GATE INVERTER SNGL 1IN SOT353; Supplier Part Number 1: M74VHC1GT04DFT1GOSCT-ND; Supplier 1: Digi-Key
footprint SOT23127P600-8N (Logic Level Shifter)
pins: 1 NC, 2 IN, 3 GND, 4 OUT, 5 VCC

## MAX14840EASA+
designator U?
TXRX 40MBPS RS485/RS422 8-SOIC; Supplier 1: Digi-Key; Supplier Part Number 1: MAX14840EASA+-ND
footprint MAX14840EASA+ (SOIC, 8-Leads, Body 4.90x3.90mm, Pitch 1.27mm, IPC Medium Density)
pins: 1 RO, 2 /RE, 3 DE, 4 DI, 5 GND, 6 A, 7 B, 8 VCC

## MC78M12CDTG
designator U?  (value not drawn)
IC REG LDO 12V 0.5A DPAK; Supplier 1: Digi-Key; Supplier Part Number 1: MC78M12CDTGOS-ND
footprint MC78M12CDTG (IC REG LDO 12V 0.5A DPAK)
pins: 1 VDD (power), 2 GND (power), 3 VOUT (power)

## MC78M15CDTRKG
designator U?
15V 500 mA Positive Voltage Regulator; Supplier 1: Digi-Key; Supplier Part Number 1: MC78M15CDTRKGOSCT-ND
footprint MC78M00
pins: 1 VDD (power), 3 VOUT (power), 4 GND (power)

## MCP6L01
designator U?  (value not drawn)
Op Amp Rail-to-Rail 1Mhz; Supplier 1: Digi-Key; Supplier Part Number 1: MCP6L01T-E/OTCT-ND
footprint MCP6L01R (SOT23, 5-Leads, Body 2.90x2.70mm, Pitch 0.95mm, IPC Medium Density)
pins: 1 VOUT (out), 2 VSS (power), 3 VIN+ (in), 4 VIN- (in), 5 VDD (power)

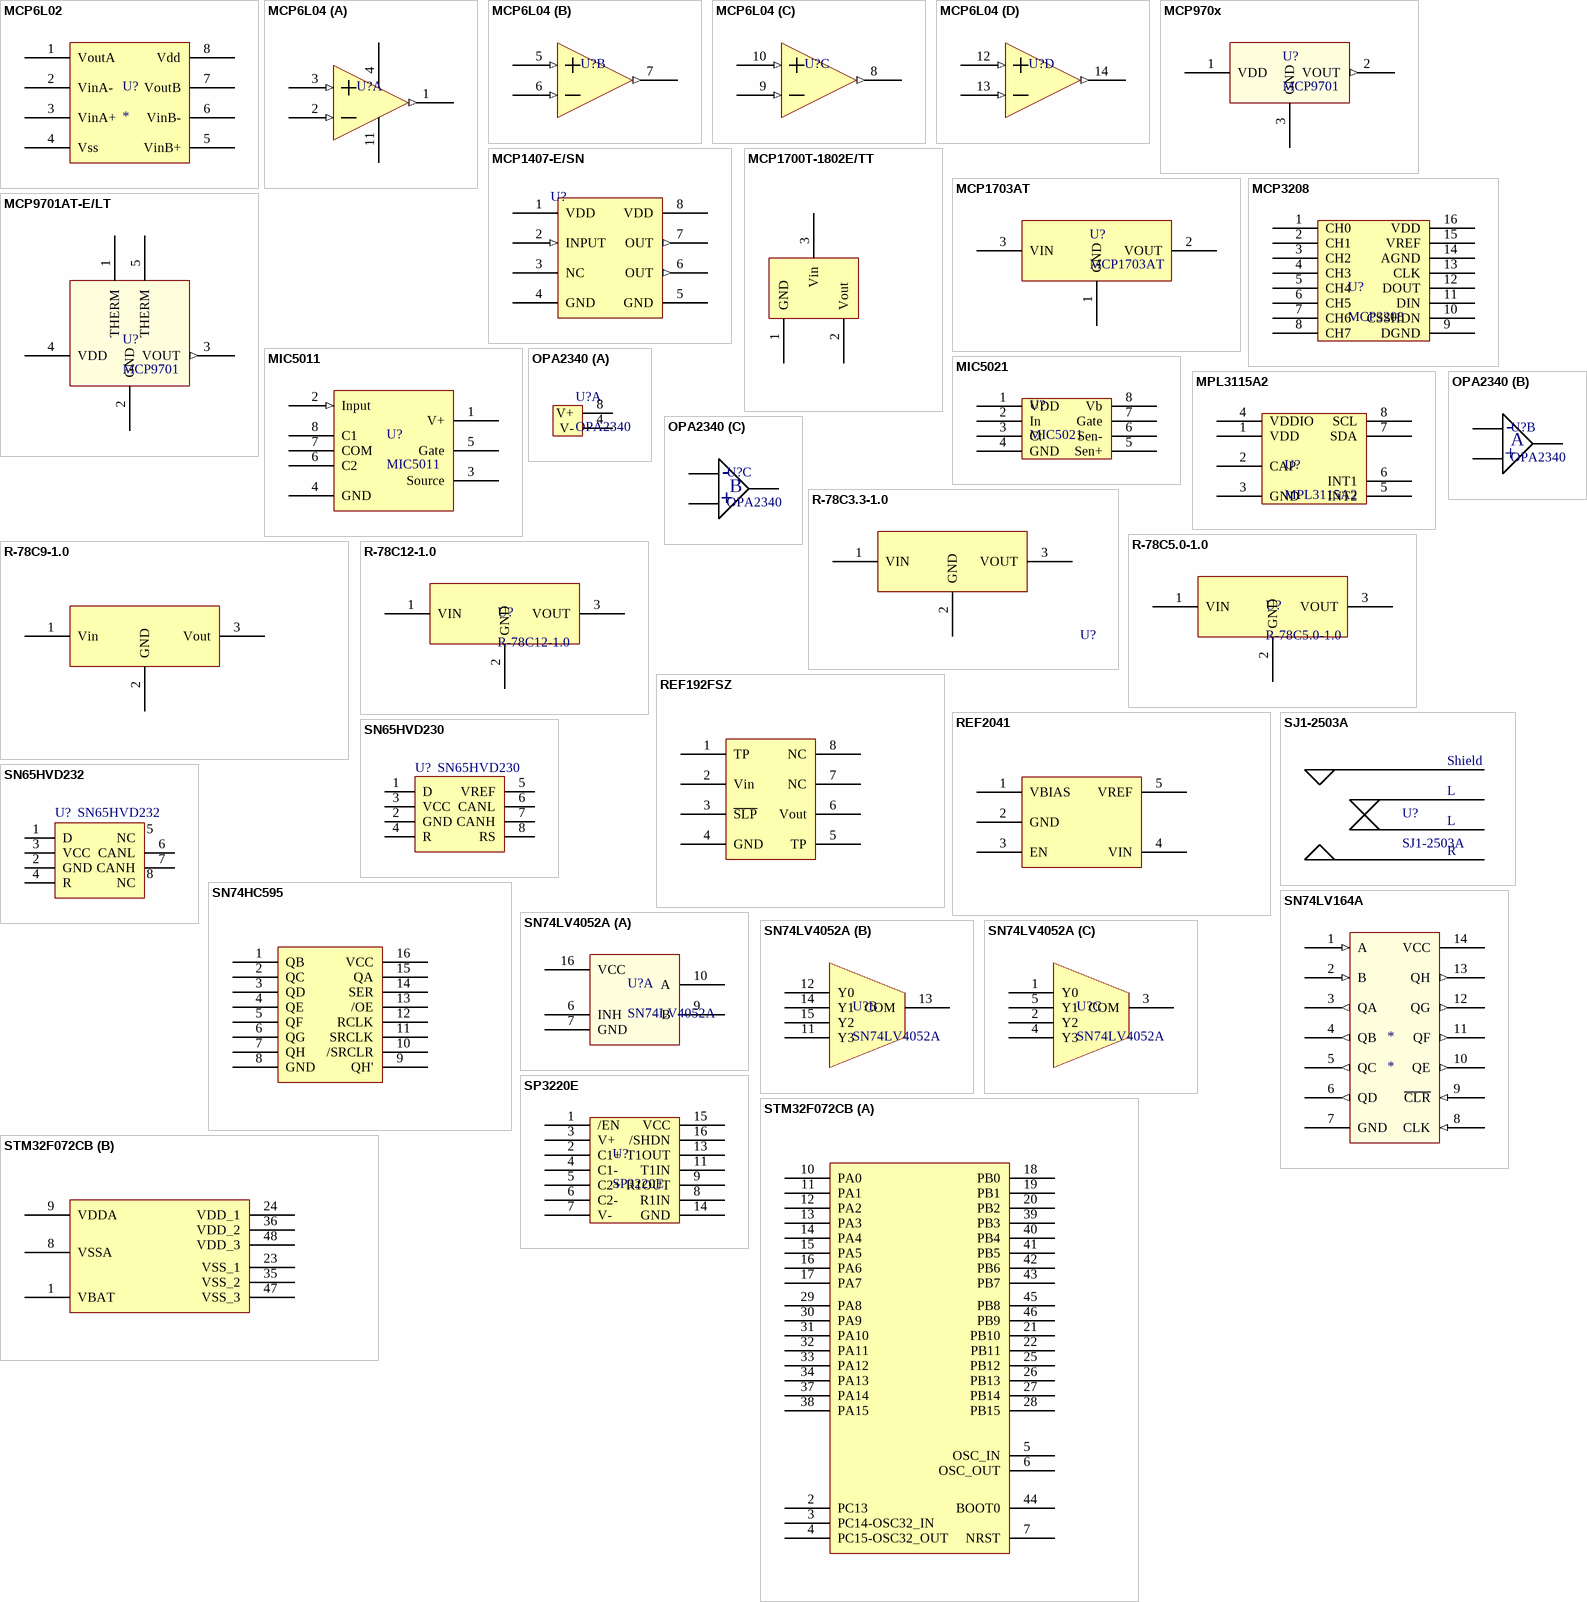
[diagram p7: symbols MCP6L02 to STM32F072CB]